# Altium footprint library HidroanaPCBLib1.PcbLib: 88 footprints (part 4 of 6)
Each footprint in its own frame and in the unit in brackets; x right, y up, seen from the top. Pads: shape width x height; smd on the part's side, far side on the other; paste and mask are expansions set on the pad; w line width, h text height; cw(c..) or ccw(c..) is an arc to the next point about the centre after c.
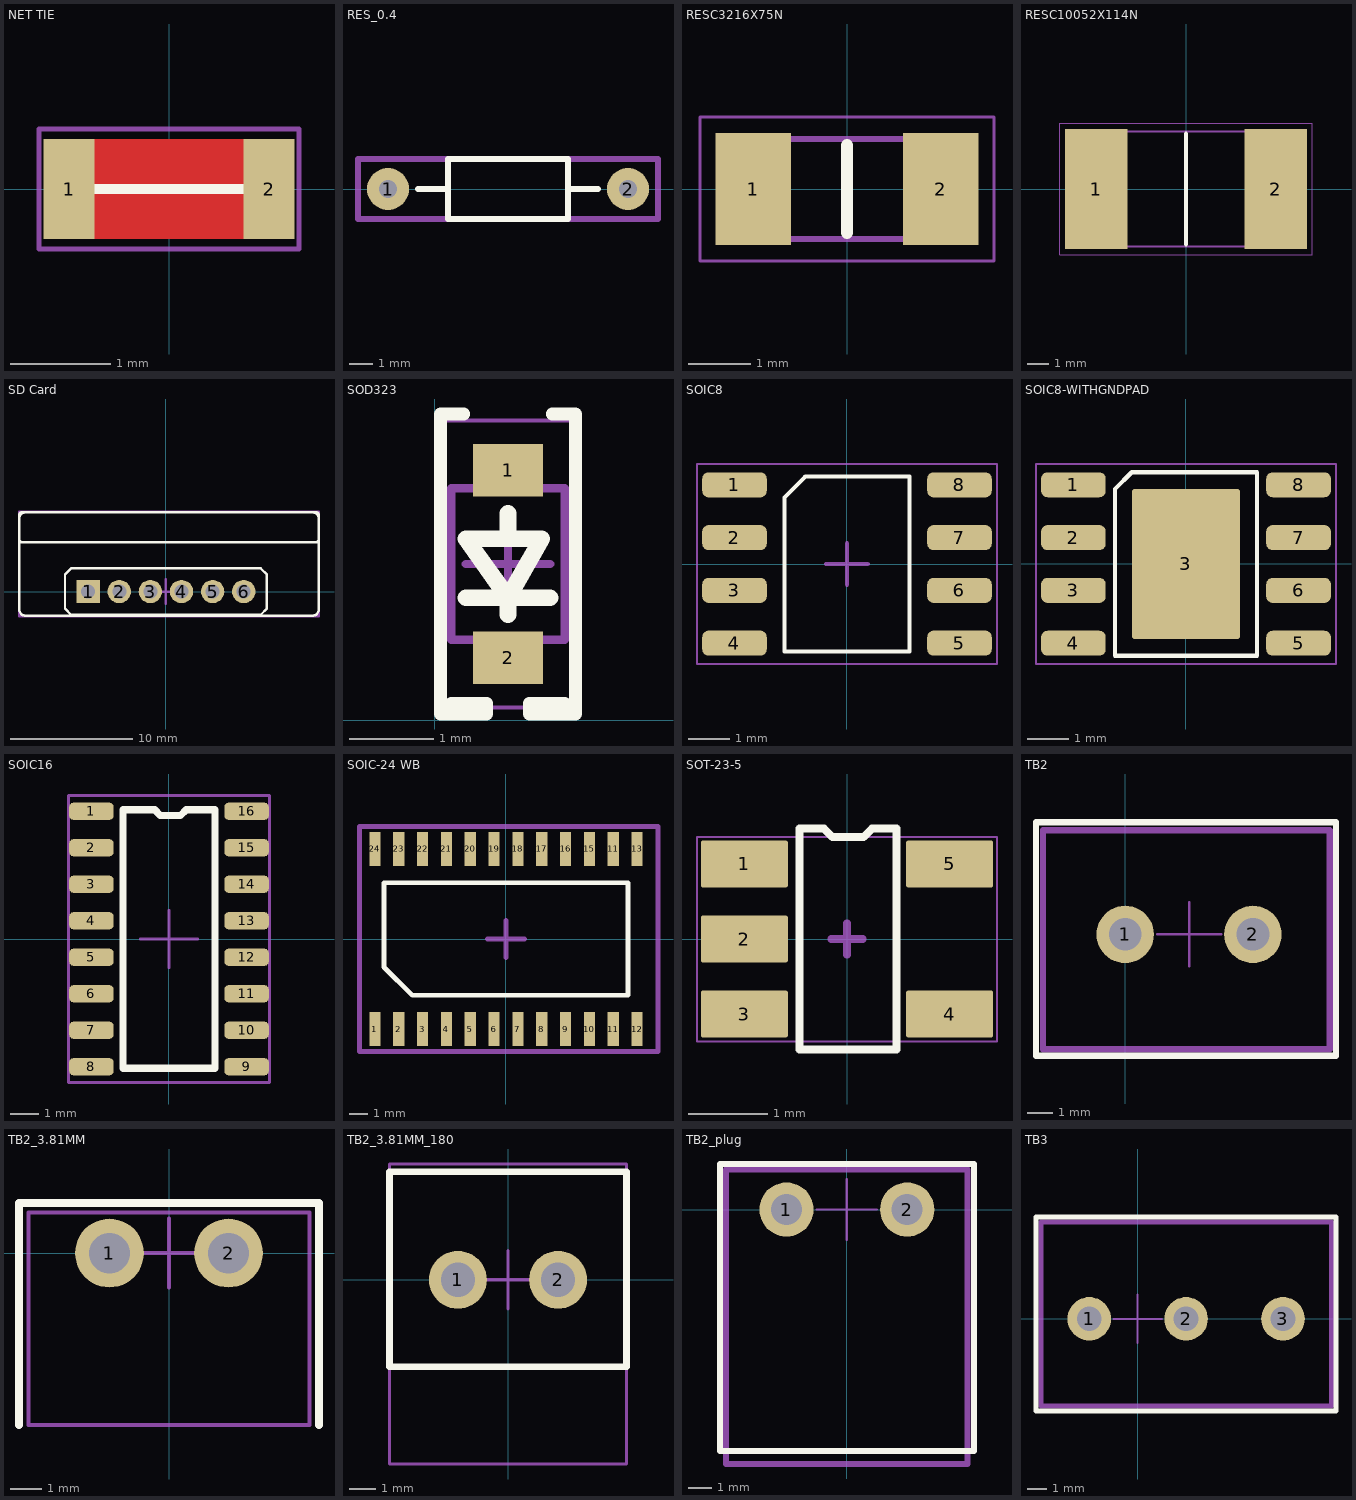
[diagram p3: the footprints below, top view; thin cyan lines are the x and y axes]

## NET TIE [mm] "NET TIE"
pads (2):
  rect 0.508x1 smd mask+0.102: 1(-1,0) 2(1,0)
Top Layer:
  rectangle: -0.8,-0.5 0.8,0.5
Top Overlay:
  lines w0.1: -0.8,-0.4 -0.8,0.4 ; -0.8,0 0.8,0 ; 0.8,-0.4 0.8,0.4
Top Component Center:
  lines w0.05: -1.3,-0.6 1.3,-0.6 1.3,0.6 -1.3,0.6 -1.3,-0.6
  lines w0.1: -0.3,0 0.3,0 ; 0,-0.3 0,0.3
Top Designator:
  text "Net tie" at -0.991,-0.252 h0.8

## RES_0.4 [mil]
pads (2):
  round 70 hole 30: 1(100,0) 2(500,0)
Top Overlay:
  lines w10: 150,0 200,0 ; 400,0 450,0 ; 200,0 200,-50 250,-50 400,-50 400,50 200,50 200,0
Top Component Center:
  lines w10: 50,-50 550,-50 550,50 50,50 50,-50
Top Designator:
  text ".Designator" at 30.1,-19.99 h60
3D body "res_0.4.step": height 115.5, standoff -100, extent 88,-50 512,41

## RESC3216X75N [mm]
pads (2):
  rect 1.2x1.8 smd: 1(-1.5,0) 2(1.5,0)
Top Overlay:
  lines w0.2: 0,-0.7 0,0.7
Top Component Center:
  lines w0.05: -2.35,-1.15 2.35,-1.15 2.35,1.15 -2.35,1.15 -2.35,-1.15
  lines w0.1: -1.6,-0.8 1.6,-0.8 1.6,0.8 -1.6,0.8 -1.6,-0.8
Top Designator:
  text ".Designator" at -7.364,-0.508 h1.52
3D body "CR1206-F_-2R70ELF.stp": height 0.75, standoff 0, extent -1.6,-0.8 1.6,0.8

## RESC10052X114N [mm]
pads (2):
  rect 2.85x5.5 smd: 1(-4.1,0) 2(4.1,0)
Top Overlay:
  lines w0.2: 0,-2.525 0,2.525
Top Component Center:
  lines w0.05: -5.775,-3 5.775,-3 5.775,3 -5.775,3 -5.775,-3
  lines w0.1: -5,-2.625 5,-2.625 5,2.625 -5,2.625 -5,-2.625
Top Designator:
  text ".Designator" at -7.618,-0.508 h1.52
3D body "CSS2H-3920K-2L50F.stp": height 1.14, standoff 0, extent -5,-2.625 5,2.625

## SD Card [mil] "Micro SD TF Card Memory Shield Module"
pads (6):
  rect 75x75 hole 45 mask+3.94: 1(-250,0)
  round 75 hole 45 mask+3.94: 2(-150,0) 3(-50,0) 4(50,0) 5(150,0) 6(250,0)
Top Overlay:
  lines w7.87: -471.38,-57.99 ccw(c-451.69,-57.99) -451.69,-77.68 471.38,-77.68 ccw(c471.38,-57.99) 491.06,-57.99 491.06,235.16 ccw(c471.38,235.16) 471.38,254.84 -451.69,254.84 ccw(c-451.69,235.16) -471.38,235.16 -471.38,-57.99 ; -471.38,166.42 ccw(c-463.5,166.42) -463.5,158.54 483.19,158.54 ccw(c483.19,166.42) 491.06,166.42 491.06,246.97 ccw(c483.19,246.97) 483.19,254.84 -463.5,254.84 ccw(c-463.5,246.97) -471.38,246.97 -471.38,166.42 ; -324.47,-54.78 -304.78,-74.47 304.78,-74.47 324.47,-54.78 324.47,54.78 304.78,74.47 -304.78,74.47 -324.47,54.78 -324.47,-54.78
Top Component Center:
  lines w7.87: -39.37,0 39.37,0 ; 0,-39.37 0,39.37 ; -472.44,-78.74 492.13,-78.74 492.13,255.91 -472.44,255.91 -472.44,-78.74
3D body "MicroSD Reader Assembly.stp": height 1649.71, standoff -196.74, extent -460.63,-15.75 484.25,248.03

## SOD323 [mm]
pads (2):
  rect 0.83x0.625 smd: 1(0.866,2.962) 2(0.866,0.737)
Top Overlay:
  lines w0.15: 0.341,3.628 0.066,3.628 0.066,0.072 ; 1.391,3.628 1.666,3.628 1.666,0.072 ; 0.066,0.072 0.612,0.072 0.612,0.199 0.193,0.199 0.066,0.072 ; 1.666,0.072 1.12,0.072 1.12,0.199 1.539,0.199 1.666,0.072
  lines w0.2: 0.366,1.45 1.366,1.45 ; 0.866,1.25 0.866,1.45 ; 0.866,2.15 0.866,2.45 ; 0.866,1.45 0.366,2.15 1.266,2.15 0.866,1.45
asdasdasdasdasd:
  lines w0.1: 0.191,0.95 0.191,2.75 1.541,2.75 1.541,0.95 0.191,0.95
asd:
  lines w0.05: 0.016,0.15 0.016,3.55 1.716,3.55 1.716,0.15 0.016,0.15
  lines w0.1: 0.366,1.85 1.366,1.85 ; 0.866,1.35 0.866,2.35
3D body "SOD-323.step": height 1.05, standoff 0, extent 0.241,0.49 1.491,3.21

## SOIC8 [mm]
pads (8):
  rrect50% 1.55x0.6 smd mask+0.102: 1(-2.7,1.9) 2(-2.7,0.633) 3(-2.7,-0.633) 4(-2.7,-1.9) 5(2.7,-1.9) 6(2.7,-0.633) 7(2.7,0.633) 8(2.7,1.9)
Top Overlay:
  lines w0.1: -1.5,-2.1 1.5,-2.1 1.5,2.1 -1,2.1 -1.5,1.6 -1.5,-2.1
Top Component Center:
  lines w0.05: -3.6,-2.4 -3.6,2.4 3.6,2.4 3.6,-2.4 -3.6,-2.4
  lines w0.1: -0.5,0 0.5,0 ; 0,-0.5 0,0.5
Top Designator:
  text ".Designator" at -2.859,-0.287 h1.27
3D body "User Library-SOIC-8-1.step": height 1.75, standoff 0, extent -3,-2.5 3,2.4

## SOIC8-WITHGNDPAD [mm] "SI (8-Pin Power SOIC with Exposed Metal Back)"
pads (9):
  rrect50% 1.55x0.6 smd mask+0.102: 1(-2.7,1.9) 2(-2.7,0.633) 3(-2.7,-0.633) 4(-2.7,-1.9) 5(2.7,-1.9) 6(2.7,-0.633) 7(2.7,0.633) 8(2.7,1.9)
  rrect5% 2.6x3.6 smd mask+0.102: 3(0,0)
Top Overlay:
  lines w0.1: -1.7,1.8 -1.3,2.2 1.7,2.2 1.7,-2.2 -1.7,-2.2 -1.7,1.8 ; -1.7,1.8 -1.7,1.8 ; -1.7,1.8 -1.7,1.8
Top Component Center:
  lines w0.05: -3.598,-2.4 -3.598,2.4 3.599,2.4 3.599,-2.4 -3.598,-2.4
  lines w0.1: -0.5,0 0.5,0 ; 0,-0.5 0,0.5
Top Designator:
  text ".Designator" at -2.859,-0.287 h1.27
3D body "User Library-SOIC-8-1.step": height 1.75, standoff 0, extent -3,-2.45 3,2.45

## SOIC16 [mm] "R-PDSO-G16"
pads (16):
  rrect50% 1.55x0.6 smd mask+0.1: 1(-2.7,4.445) 2(-2.7,3.175) 3(-2.7,1.905) 4(-2.7,0.635) 5(-2.7,-0.635) 6(-2.7,-1.905) 7(-2.7,-3.175) 8(-2.7,-4.445) 9(2.7,-4.445) 10(2.7,-3.175) 11(2.7,-1.905) 12(2.7,-0.635) 13(2.7,0.635) 14(2.7,1.905) 15(2.7,3.175) 16(2.7,4.445)
Top Overlay:
  lines w0.254: -1.6,-4.5 1.6,-4.5 1.6,4.5 0.6,4.5 0.4,4.3 -0.3,4.3 -0.5,4.5 -1.6,4.5 -1.6,-4.5
Top Component Center:
  lines w0.1: -1,0 1,0 ; 0,-1 0,1 ; -3.5,-5 3.5,-5 3.5,5 -3.5,5 -3.5,-5
Top Designator:
  text ".Designator" at -2.252,-0.226 h1
3D body "User Library-SOIC-16-1.step": height 1.4, standoff 0, extent -3,-4.95 3,4.95

## SOIC-24 WB [mm]
pads (24):
  rect 0.6x1.8 smd mask+0.05: 1(-6.985,-4.8) 2(-5.715,-4.8) 3(-4.445,-4.8) 4(-3.175,-4.8) 5(-1.905,-4.8) 6(-0.635,-4.8) 7(0.635,-4.8) 8(1.905,-4.8) 9(3.175,-4.8) 10(4.445,-4.8) 11(5.715,-4.8) 11(5.715,4.8) 12(6.985,-4.8) 13(6.985,4.8) 15(4.445,4.8) 16(3.175,4.8) 17(1.905,4.8) 18(0.635,4.8) 19(-0.635,4.8) 20(-1.905,4.8) 21(-3.175,4.8) 22(-4.445,4.8) 23(-5.715,4.8) 24(-6.985,4.8)
Top Overlay:
  lines w0.254: -6.5,-1.5 -5,-3 6.5,-3 6.5,3 -6.5,3 -6.5,-1.5
Top Component Center:
  lines w0.254: -1,0 1,0 ; 0,-1 0,1 ; -7.8,-6 8.1,-6 8.1,6 -7.8,6 -7.8,-6
Top Designator:
  text "'.Designator'" at -3.686,-0.345 h1.52
3D body "User Library-SOIC_24-300.STEP": height 2.6, standoff 0, extent -7.55,-5.2 7.85,5.2

## SOT-23-5 [mm]
height 1.45
pads (5):
  rrect9% 1.1x0.6 smd mask+0.025: 1(-1.3,0.95) 2(-1.3,0) 3(-1.3,-0.95) 4(1.3,-0.95) 5(1.3,0.95)
Top Overlay:
  lines w0.1: -0.6,-1.4 0.625,-1.4 0.625,1.4 0.319,1.4 0.208,1.29 -0.183,1.29 -0.294,1.4 -0.6,1.4 -0.6,-1.4
Top Component Center:
  lines w0.025: -1.9,-1.3 1.9,-1.3 1.9,1.29 -1.9,1.29 -1.9,-1.3
  lines w0.1: 0,0.2 0,-0.2 0,0 -0.2,0 0.2,0
Top Designator:
  text ".Designator" at -2.859,-0.287 h1.27
3D body "lp2985-33dbvr.stp": height 1.2, standoff 0, extent -1.4,-1.45 1.4,1.45

## TB2 [mil]
pads (2):
  round 90 hole 51.18: 1(0,300) 2(200,300)
Top Overlay:
  lines w10: -139.61,110 330,110 330,475.54 -139.61,475.54 -139.61,110
Top Component Center:
  lines w3.94: 50,300 150,300 ; 100,250 100,350
  lines w10: -128.62,120 320,120 320,463.18 -128.62,463.18 -128.62,120
Top Designator:
  text ".Designator" at -199.9,280.01 h60
3D body "691213510002.stp": height 393.7, standoff -137.8, extent -123.67,140.85 323.57,459.74

## TB2_3.81MM [mm]
pads (2):
  round 2.2 hole 1.3 mask+0.05: 1(-1.905,0) 2(1.905,0)
Top Overlay:
  lines w0.254: -4.8,-5.5 -4.8,1.5 ; -4.8,1.6 4.8,1.6 4.8,-5.5
Top Component Center:
  lines w0.124: -1.1,0 1.1,0 ; 0,-1.1 0,1.1 ; -4.5,-5.5 4.5,-5.5 4.5,1.3 -4.5,1.3 -4.5,-5.5
Top Designator:
  text ".Designator" at -3.434,-2.745 h1.52
3D body "User Library-KEFA 3_81mm_2pin_RA.step": height 7.88, standoff -3.4, extent -4.505,-17.1 4.505,1.3

## TB2_3.81MM_180 [mm] "TERM.BLK.3.81MM 2P 180C MALE BLACK CLOSED"
pads (2):
  round 2.2 hole 1.3 mask+0.05: 1(-1.905,0) 2(1.905,0)
Top Overlay:
  lines w0.254: -4.5,-3.3 4.5,-3.3 4.5,4.1 -4.5,4.1 -4.5,-3.3
Top Component Center:
  lines w0.124: -1.1,0 1.1,0 ; 0,-1.1 0,1.1 ; -4.5,-7 -4.5,4.4 4.5,4.4 4.5,-7 -4.5,-7
Top Designator:
  text ".Designator" at -3.434,1.955 h1.52
3D body "User Library-15EDG-3_81-02P.STEP": height 18.35, standoff -3.4, extent -4.22,-6.7 4.22,4.33

## TB2_plug [mil]
pads (2):
  round 90 hole 51.18: 1(-100,0) 2(100,0)
Top Overlay:
  lines w10: -210,-400 210.53,-400 210.53,75.43 -210,75.43 -210,-400
Top Component Center:
  lines w3.94: -50,0 50,0 ; 0,-50 0,50
  lines w10: -200,-421.7 200,-421.7 200,66.21 -200,66.21 -200,-421.7
Top Designator:
  text ".Designator" at -299.9,-119.99 h60
3D body "User Library-2EDGR-5_08-02P.step": height 338.58, standoff -141.73, extent -198.84,-414.86 201.16,61.52

## TB3 [mil]
pads (3):
  round 90 hole 51.18: 1(-100,0) 2(100,0) 3(300,0)
Top Overlay:
  lines w10: -210,-190 409.48,-190 409.48,210 -210,210 -210,-190
Top Component Center:
  lines w3.94: -50,0 50,0 ; 0,-50 0,50
  lines w10: -200,-180 400,-180 400,200 -200,200 -200,-180
Top Designator:
  text ".Designator" at -199.9,-19.99 h60
3D body "TBL-Terminal Blocks - Rising Cage - 5.08 mm.stp": height 543.31, standoff -137.8, extent -200,-180 223.62,205.83